# Altium footprint library bldc.PcbLib: 76 footprints (part 3 of 5)
Each footprint in its own frame and in the unit in brackets; x right, y up, seen from the top. Pads: shape width x height; smd on the part's side, far side on the other; paste and mask are expansions set on the pad; w line width, h text height; cw(c..) or ccw(c..) is an arc to the next point about the centre after c.
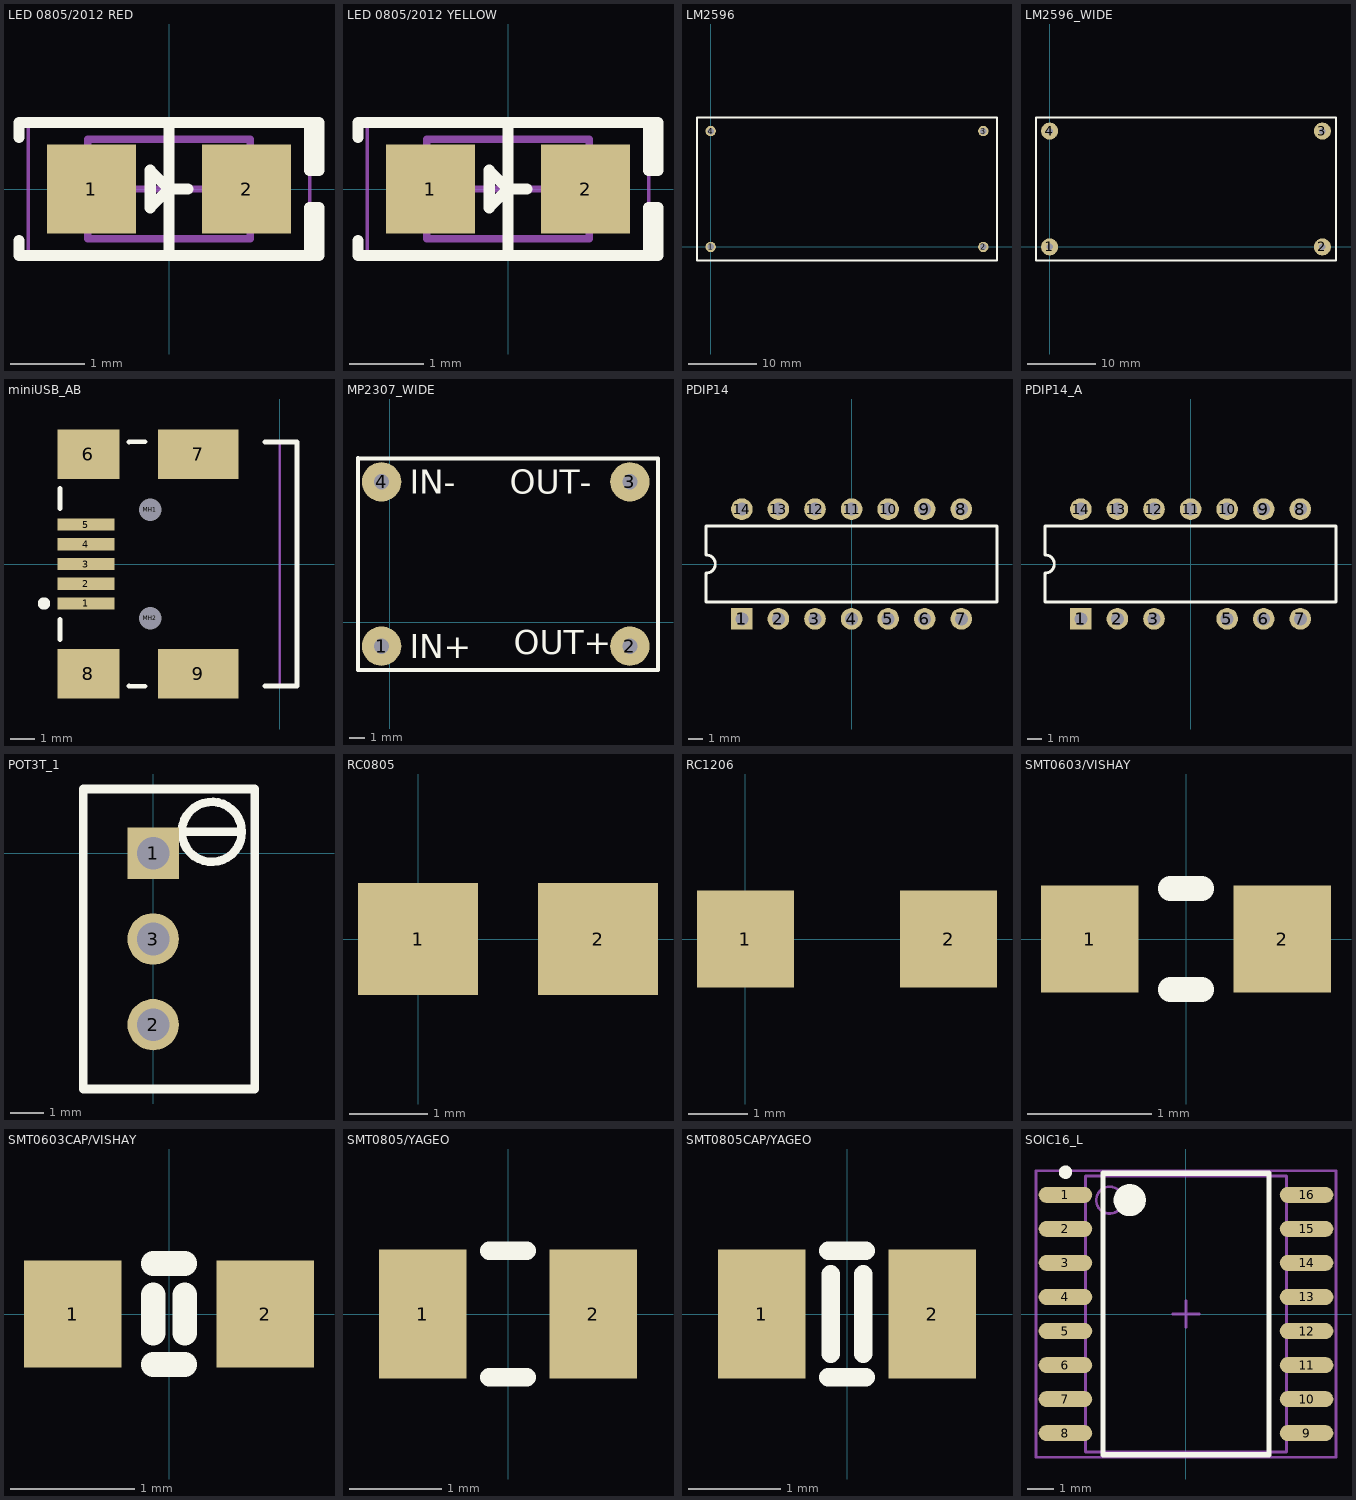
[diagram p2: the footprints below, top view; thin cyan lines are the x and y axes]

## LED 0805/2012 RED [mm] "Chip Diode, 2-Leads, Body 2.00x1.25mm, IPC Medium Density"
height 0.7
pads (2):
  rect 1.2x1.2 smd: 1(-1.05,0) 2(1.05,0)
Top Overlay:
  lines w0.15: -2.032,-0.7 -2.032,-0.9 1.905,-0.9 ; -2.032,0.7 -2.032,0.9 1.905,0.9 ; 0,-0.9 0,0.9 ; 0.254,0 0,0 ; 0,0 -0.254,0.254 -0.254,-0.254 0,0 ; 1.905,-0.9 2.032,-0.9 2.032,-0.254 1.905,-0.254 1.905,-0.9 ; 1.905,0.9 2.032,0.9 2.032,0.254 1.905,0.254 1.905,0.9
Mechanical 13:
  lines w0.1: -1.1,-0.675 -1.1,0.675 1.1,0.675 1.1,-0.675 -1.1,-0.675
Mechanical 15:
  lines w0.05: -1.905,-0.95 -1.905,0.95 1.905,0.95 1.905,-0.95 -1.905,-0.95
  lines w0.1: -0.5,0 0.5,0 ; 0,-0.5 0,0.5
3D body "LED 0805 Lens RED.STEP": height 0.9, standoff 0.3, extent -0.65,-0.625 0.65,0.625
3D body "LED 0805 Base RED.STEP": height 0.4, standoff 0, extent -1,-0.625 1,0.625

## LED 0805/2012 YELLOW [mm] "Chip Diode, 2-Leads, Body 2.00x1.25mm, IPC Medium Density"
height 0.7
pads (2):
  rect 1.2x1.2 smd: 1(-1.05,0) 2(1.05,0)
Top Overlay:
  lines w0.15: -2.032,-0.7 -2.032,-0.9 1.905,-0.9 ; -2.032,0.7 -2.032,0.9 1.905,0.9 ; 0,-0.9 0,0.9 ; 0.254,0 0,0 ; 0,0 -0.254,0.254 -0.254,-0.254 0,0 ; 1.905,-0.9 1.905,-0.254 2.032,-0.254 2.032,-0.9 1.905,-0.9 ; 1.905,0.9 1.905,0.254 2.032,0.254 2.032,0.9 1.905,0.9
Mechanical 13:
  lines w0.1: -1.1,-0.675 1.1,-0.675 1.1,0.675 -1.1,0.675 -1.1,-0.675
Mechanical 15:
  lines w0.05: -1.905,-0.95 1.905,-0.95 1.905,0.95 -1.905,0.95 -1.905,-0.95
  lines w0.1: -0.5,0 0.5,0 ; 0,-0.5 0,0.5
3D body "LED 0805 Base YELLOW.STEP": height 0.4, standoff 0, extent -1,-0.625 1,0.625
3D body "LED 0805 Lens YELLOW.STEP": height 0.9, standoff 0.3, extent -0.65,-0.625 0.65,0.625

## LM2596 [mil]
pads (4):
  round 60 hole 38: 1(0,0) 2(1574.8,0) 3(1574.8,669.29) 4(0,669.29)
Top Overlay:
  lines w10: -78.74,-78.74 -78.74,748.03 1653.54,748.03 1653.54,-78.74 -78.74,-78.74

## LM2596_WIDE [mm]
pads (4):
  round 2.5 hole 0.965: 1(0,0) 2(40,0) 3(40,17) 4(0,17)
Top Overlay:
  lines w0.254: -2,-2 42,-2 42,19 -2,19 -2,-2
3D body "Step Down voltage regulator LM2596.stp": height 14.2, standoff 0.5, extent -1.434,-2.091 41.566,19.109

## miniUSB_AB [mm] "Connector; USB2.0, Type AB, SM; 5 Position; Right Angle"
height 3.9
pads (11):
  rect 2.3x0.5 smd: 1(-7.85,-1.6) 2(-7.85,-0.8) 3(-7.85,0) 4(-7.85,0.8) 5(-7.85,1.6)
  rect 2.5x2 smd: 6(-7.75,4.45) 8(-7.75,-4.45)
  rect 3.262x2 smd: 7(-3.302,4.445) 9(-3.302,-4.445)
  round 0.6 hole 0.9 unplated: MH1(-5.25,2.2) MH2(-5.25,-2.2)
Top Overlay:
  circle w0.25: c-9.55,-1.6 r0.125
  lines w0.2: -8.9,-3.05 -8.9,-2.25 ; -8.9,2.25 -8.9,3.05 ; -6.1,-4.95 -5.461,-4.953 ; -6.1,4.95 -5.461,4.953 ; -0.6,-4.95 0.7,-4.95 0.7,4.95 -0.6,4.95
Mechanical 1:
  lines w0.1: 0,-4.95 0,4.95
  text "PCB Edge" at 0.432,-4.036 h0.25
3D body "MOLEX_0678038020.STEP": height 4, standoff -0.95, extent -8.294,-4.95 0.706,4.95

## MP2307_WIDE [mm]
pads (4):
  round 2.5 hole 0.965: 1(-0.508,-1.524) 2(15.24,-1.524) 3(15.24,8.89) 4(-0.508,8.89)
Top Overlay:
  lines w0.254: -2,10.364 17.018,10.364 17.018,-3.048 -2,-3.048 -2,10.414
  text "IN+" at 1.27,-2.286 h1.52
  text "IN-" at 1.27,8.128 h1.52
  text "OUT-" at 7.62,8.128 h1.52
  text "OUT+" at 7.874,-2.032 h1.52
3D body "MIni - 360.step": height 4.75, standoff 1, extent -1.524,-2.348 16.476,9.652

## PDIP14 [mm] "DIP; 14 Leads; Row Spacing 7.62 mm; Pitch 2.54 mm"
height 5.33
pads (14):
  rect 1.5x1.5 hole 0.9: 1(-7.62,-3.81)
  round 1.5 hole 0.9: 2(-5.08,-3.81) 3(-2.54,-3.81) 4(0,-3.81) 5(2.54,-3.81) 6(5.08,-3.81) 7(7.62,-3.81) 8(7.62,3.81) 9(5.08,3.81) 10(2.54,3.81) 11(0,3.81) 12(-2.54,3.81) 13(-5.08,3.81) 14(-7.62,3.81)
Top Overlay:
  lines w0.2: -10.1,-2.65 -10.1,-0.635 ccw(c-10.1,0) -10.1,0.635 -10.1,2.65 10.1,2.65 10.1,-2.65 -10.1,-2.65

## PDIP14_A [mm] "DIP; 14 Leads (1 Absent); Row Spacing 7.62 mm; Pitch 2.54 mm"
height 5.33
pads (13):
  rect 1.5x1.5 hole 0.9: 1(-7.62,-3.81)
  round 1.5 hole 0.9: 2(-5.08,-3.81) 3(-2.54,-3.81) 5(2.54,-3.81) 6(5.08,-3.81) 7(7.62,-3.81) 8(7.62,3.81) 9(5.08,3.81) 10(2.54,3.81) 11(0,3.81) 12(-2.54,3.81) 13(-5.08,3.81) 14(-7.62,3.81)
Top Overlay:
  lines w0.2: -10.1,-2.65 -10.1,-0.635 ccw(c-10.1,0) -10.1,0.635 -10.1,2.65 10.1,2.65 10.1,-2.65 -10.1,-2.65

## POT3T_1 [mil]
pads (3):
  rect 60x60 hole 38: 1(0,0)
  round 60 hole 38: 2(0,-200) 3(0,-100)
Top Overlay:
  circle w10: c68.5,25 r35
  lines w10: 33.5,25 103.5,25 ; -81.5,-275 118.5,-275 118.5,75 -81.5,75 -81.5,-275

## RC0805 [mil]
pads (2):
  rect 60x56 smd: 1(0,0) 2(90,0)
3D body: height 31.5, standoff 0, extent 0,-25.1 80.71,25.1

## RC1206 [mil]
pads (2):
  rect 64x64 smd: 1(0,0) 2(134,0)
3D body "User Library-SMD Resistors1206.STEP": height 20.67, standoff -0.98, extent 0.98,-31.7 126.97,31.69

## SMT0603/VISHAY [mm]
pads (2):
  rect 0.787x0.864 smd: 1(-0.775,0) 2(0.775,0)
Top Overlay:
  lines w0.2: -0.127,-0.406 0.127,-0.406 ; -0.127,0.406 0.127,0.406
3D body "User Library-SMD Resistors0603.STEP": height 0.45, standoff -0.01, extent -0.775,-0.43 0.775,0.43

## SMT0603CAP/VISHAY [mm]
pads (2):
  rect 0.787x0.864 smd: 1(-0.775,0) 2(0.775,0)
Top Overlay:
  lines w0.2: -0.127,-0.406 0.127,-0.406 ; -0.127,-0.152 -0.127,0.152 ; -0.127,0.406 0.127,0.406 ; 0.127,-0.152 0.127,0.152
3D body "User Library-Chip Cap_MLCC_0603 (1608).STEP": height 0.5, standoff 0, extent -0.8,-0.4 0.8,0.4

## SMT0805/YAGEO [mm]
pads (2):
  rect 0.95x1.4 smd: 1(-0.925,0) 2(0.925,0)
Top Overlay:
  lines w0.2: -0.203,-0.686 0.203,-0.686 ; -0.203,0.686 0.203,0.686
3D body "User Library-SMD Resistors0805.STEP": height 0.45, standoff -0.01, extent -1,-0.63 1,0.63

## SMT0805CAP/YAGEO [mm]
pads (2):
  rect 0.95x1.4 smd: 1(-0.925,0) 2(0.925,0)
Top Overlay:
  lines w0.2: -0.203,-0.686 0.203,-0.686 ; -0.203,0.686 0.203,0.686 ; -0.178,-0.432 -0.178,0.432 ; 0.178,-0.432 0.178,0.432
3D body: height 0.8, standoff 0, extent -1.025,-0.637 1.025,0.638

## SOIC16_L [mm] "SOIC, 16-Leads, Body 10.3x7.5mm, Pitch 1.27mm, IPC High Density"
height 2.65
pads (16):
  oval 2x0.6 smd: 1(-4.5,4.445) 2(-4.5,3.175) 3(-4.5,1.905) 4(-4.5,0.635) 5(-4.5,-0.635) 6(-4.5,-1.905) 7(-4.5,-3.175) 8(-4.5,-4.445) 9(4.5,-4.445) 10(4.5,-3.175) 11(4.5,-1.905) 12(4.5,-0.635) 13(4.5,0.635) 14(4.5,1.905) 15(4.5,3.175) 16(4.5,4.445)
Top Overlay:
  circle w0.25: c-4.5,5.295 r0.125
  circle w0.6: c-2.1,4.25 r0.3
  lines w0.2: -3.1,-5.25 -3.1,5.25 3.1,5.25 3.1,-5.25 -3.1,-5.25
Mechanical 13:
  circle w0.1: c-2.85,4.25 r0.5
  lines w0.1: -3.75,-5.15 -3.75,5.15 3.75,5.15 3.75,-5.15 -3.75,-5.15
Mechanical 15:
  lines w0.1: -0.5,0 0.5,0 ; 0,-0.5 0,0.5 ; -5.6,-5.35 -5.6,5.35 5.6,5.35 5.6,-5.35 -5.6,-5.35
3D body: height 2.65, standoff 0, extent -3.75,-5.15 3.75,5.15